# Altium footprint library Connectors SMD.PcbLib: 130 footprints (part 3 of 12) (continued)
## LUMBERG_161314 [mm] "Right Angle Surface Mount Power Supply Chassis Socket With Break Contacts"
height 11
pads (6):
  rect 2.7x2 smd: 1(-4.5,-5.5) 2(1.6,-5.5) 3(-4.5,5.5) 3(1.6,5.5)
  round 1 hole 1.6 unplated mask+0.3: 4(-4.5,0)
  round 1 hole 1.8 unplated mask+0.4: 4(0,0)
Top Overlay:
  lines w0.2: -6.25,-4.5 -9.5,-4.5 -9.5,4.5 -6.25,4.5 ; -6,-4.1 -6,-3 -1.7,-3 ccw(c-1.7,0) -1.7,3 -6,3 -6,4.1 ; -6,-4 4,-4 ; -6,4 4,4 ; -2.75,-4.5 -0.15,-4.5 ; -2.75,4.5 -0.15,4.5 ; -2.75,4.9 -0.15,4.9 ; 3.35,-4.5 4,-4.5 ; 3.35,4.5 4,4.5 4,-4.5 ; 3.35,4.9 4.4,4.9 4.4,-2.4 4,-2.4 ; 4.4,-1.7 5.3,-1.7 5.3,-4.5 4,-4.5
Mechanical 8:
  circle w0.1: c0,0 r0.9
  circle w0.1: c-4.5,0 r0.8
  lines w0.1: -5,-5.5 -4.5,-5.5 ; -5,0 -4.5,0 ; -5,5.5 -4.5,5.5 ; -4.5,-6 -4.5,-5.5 ; -4.5,-5 -4.5,-5.5 ; -4.5,-0.5 -4.5,0 ; -4.5,0.5 -4.5,0 ; -4.5,5 -4.5,5.5 ; -4.5,6 -4.5,5.5 ; -4,-5.5 -4.5,-5.5 ; -4,0 -4.5,0 ; -4,5.5 -4.5,5.5 ; -0.5,0 0,0 ; 0,-0.5 0,0 ; 0,0.5 0,0 ; 0.5,0 0,0 ; 1.1,-5.5 1.6,-5.5 ; 1.1,5.5 1.6,5.5 ; 1.6,-6 1.6,-5.5 ; 1.6,-5 1.6,-5.5 ; 1.6,5 1.6,5.5 ; 1.6,6 1.6,5.5 ; 2.1,-5.5 1.6,-5.5 ; 2.1,5.5 1.6,5.5 ; -5.85,-6.5 -5.85,-4.5 -3.15,-4.5 -3.15,-6.5 -5.85,-6.5 ; -5.85,4.5 -3.15,4.5 -3.15,6.5 -5.85,6.5 -5.85,4.5 ; 0.25,-6.5 2.95,-6.5 2.95,-4.5 0.25,-4.5 0.25,-6.5 ; 0.25,4.5 2.95,4.5 2.95,6.5 0.25,6.5 0.25,4.5
Mechanical 14:
  lines w0.1: -6,-4.5 -6,-3 -1.7,-3 ccw(c-1.7,0) -1.7,3 -6,3 -6,4.5 ; -6,-4 4,-4 ; -6,4 4,4 ; -5.25,-4.9 -3.75,-4.9 ; -5.25,-4.5 -5.25,-6.3 -3.75,-6.3 -3.75,-4.5 ; -5.25,4.5 -5.25,6.3 -3.75,6.3 -3.75,4.9 ; -5.25,4.9 4.4,4.9 4.4,-2.4 4,-2.4 ; 0.85,-4.9 2.35,-4.9 ; 0.85,-4.5 0.85,-6.3 2.35,-6.3 2.35,-4.5 ; 0.85,4.9 0.85,6.3 2.35,6.3 2.35,4.9 ; 4.4,-1.7 5.3,-1.7 5.3,-4.5 4,-4.5 ; 4,-4.5 -9.5,-4.5 -9.5,4.5 4,4.5 4,-4.5
Mechanical 15:
  lines w0.1: -9.75,-6.75 -9.75,6.75 5.55,6.75 5.55,-6.75 -9.75,-6.75
3D body: height 11, standoff -1.2, extent -9.5,-6.3 5.3,6.3

## MITSUBISHI_FU-456RDF-9M2-A [mm] "1.3um Band Transmitter Optical Sub Assembly  (TOSA) Laser Module"
height 14.53
pads (8):
  round 1.1 hole 0.6: 1(-1.7,2.75) 8(-1.7,-2.75)
  rect 1.05x0.45 smd: 2(0,1.975) 3(0,1.185) 4(0,0.395) 5(0,-0.395) 6(0,-1.185) 7(0,-1.975)
Top Overlay:
  circle w0.2: c-13.75,0.2 r2.4
  circle w0.2: c-13.75,0.2 r1
  circle w0.2: c-13.75,0.2 r1.495
  lines w0.2: -12.915,-2.05 -5.45,-2.05 -4.05,-2.75 -2.6,-2.75 ; -12.915,2.45 -4.65,2.45 -4.05,2.75 -2.6,2.75 ; -0.8,-2.75 0.65,-2.75 0.65,-2.605 ; -0.8,2.75 0.65,2.75 0.65,2.605
  text "1" at -3.088,1.25 h1
Mechanical 8:
  lines w0.1: -14,0.2 -13.75,0.2 ; -13.75,-0.05 -13.75,0.2 ; -13.75,0.45 -13.75,0.2 ; -13.5,0.2 -13.75,0.2 ; -1.95,-2.75 -1.7,-2.75 ; -1.95,2.75 -1.7,2.75 ; -1.7,-3 -1.7,-2.75 ; -1.7,-2.5 -1.7,-2.75 ; -1.7,2.5 -1.7,2.75 ; -1.7,3 -1.7,2.75 ; -1.45,-2.75 -1.7,-2.75 ; -1.45,2.75 -1.7,2.75 ; -0.354,-0.354 0,0 ; -0.354,0.354 0,0 ; -0.25,-1.975 0,-1.975 ; -0.25,-1.185 0,-1.185 ; -0.25,-0.395 0,-0.395 ; -0.25,0.395 0,0.395 ; -0.25,1.185 0,1.185 ; -0.25,1.975 0,1.975 ; 0,-2.225 0,-1.975 ; 0,-1.725 0,-1.975 ; 0,-1.435 0,-1.185 ; 0,-0.935 0,-1.185 ; 0,-0.645 0,-0.395 ; 0,-0.145 0,-0.395 ; 0,0.145 0,0.395 ; 0,0.645 0,0.395 ; 0,0.935 0,1.185 ; 0,1.435 0,1.185 ; 0,1.725 0,1.975 ; 0,2.225 0,1.975 ; 0.25,-1.975 0,-1.975 ; 0.25,-1.185 0,-1.185 ; 0.25,-0.395 0,-0.395 ; 0.25,0.395 0,0.395 ; 0.25,1.185 0,1.185 ; 0.25,1.975 0,1.975 ; 0.354,-0.354 0,0 ; 0.354,0.354 0,0
Mechanical 14:
  circle w0.1: c-13.75,0.2 r2.4
  circle w0.1: c-13.75,0.2 r1
  circle w0.1: c-13.75,0.2 r1.495
  lines w0.1: -12.915,-2.05 -5.45,-2.05 -4.05,-2.75 -2,-2.75 cw(c-1.7,-2.75) -1.4,-2.75 0.65,-2.75 0.65,2.75 -1.4,2.75 cw(c-1.7,2.75) -2,2.75 -4.05,2.75 -4.65,2.45 -12.915,2.45 ; -2.2,-2.75 cw(c-1.7,-2.75) -1.2,-2.75 ; -2.2,2.75 ccw(c-1.7,2.75) -1.2,2.75 ; -0.5,-2.175 0.5,-2.175 0.5,-1.775 -0.5,-1.775 -0.5,-2.175 ; -0.5,-1.385 0.5,-1.385 0.5,-0.985 -0.5,-0.985 -0.5,-1.385 ; -0.5,-0.595 0.5,-0.595 0.5,-0.195 -0.5,-0.195 -0.5,-0.595 ; -0.5,0.195 0.5,0.195 0.5,0.595 -0.5,0.595 -0.5,0.195 ; -0.5,0.985 0.5,0.985 0.5,1.385 -0.5,1.385 -0.5,0.985 ; -0.5,1.775 0.5,1.775 0.5,2.175 -0.5,2.175 -0.5,1.775
  text "1" at -3.088,1.25 h1
3D body: height 13.97, standoff -1.07, extent -16.15,-2.75 0.65,2.75

## MOLEX_45802-0223 [mm] "1.20mm by 2.00mm Pitch HD Mezzanine Receptacle, 299 Circuits, 8.00mm Unmated Height, 23 Rows"
height 10.51
pads (307):
  rrect100% 1x0.8 smd: 1A(22,-7.2) 1B(22,-6) 1C(22,-4.8) 1D(22,-3.6) 1E(22,-2.4) 1F(22,-1.2) 1G(22,0) 1H(22,1.2) 1I(22,2.4) 1J(22,3.6) 1K(22,4.8) 1L(22,6) 1M(22,7.2) 2A(20,-7.2) 2B(20,-6) 2C(20,-4.8) 2D(20,-3.6) 2E(20,-2.4) 2F(20,-1.2) 2G(20,0) 2H(20,1.2) 2I(20,2.4) 2J(20,3.6) 2K(20,4.8) 2L(20,6) 2M(20,7.2) 3A(18,-7.2) 3B(18,-6) 3C(18,-4.8) 3D(18,-3.6) 3E(18,-2.4) 3F(18,-1.2) 3G(18,0) 3H(18,1.2) 3I(18,2.4) 3J(18,3.6) 3K(18,4.8) 3L(18,6) 3M(18,7.2) 4A(16,-7.2) 4B(16,-6) 4C(16,-4.8) 4D(16,-3.6) 4E(16,-2.4) 4F(16,-1.2) 4G(16,0) 4H(16,1.2) 4I(16,2.4) 4J(16,3.6) 4K(16,4.8) 4L(16,6) 4M(16,7.2) 5A(14,-7.2) 5B(14,-6) 5C(14,-4.8) 5D(14,-3.6) 5E(14,-2.4) 5F(14,-1.2) 5G(14,0) 5H(14,1.2) 5I(14,2.4) 5J(14,3.6) 5K(14,4.8) 5L(14,6) 5M(14,7.2) 6A(12,-7.2) 6B(12,-6) 6C(12,-4.8) 6D(12,-3.6) 6E(12,-2.4) 6F(12,-1.2) 6G(12,0) 6H(12,1.2) 6I(12,2.4) 6J(12,3.6) 6K(12,4.8) 6L(12,6) 6M(12,7.2) 7A(10,-7.2) 7B(10,-6) 7C(10,-4.8) 7D(10,-3.6) 7E(10,-2.4) 7F(10,-1.2) 7G(10,0) 7H(10,1.2) 7I(10,2.4) 7J(10,3.6) 7K(10,4.8) 7L(10,6) 7M(10,7.2) 8A(8,-7.2) 8B(8,-6) 8C(8,-4.8) 8D(8,-3.6) 8E(8,-2.4) 8F(8,-1.2) 8G(8,0) 8H(8,1.2) 8I(8,2.4) 8J(8,3.6) 8K(8,4.8) 8L(8,6) 8M(8,7.2) 9A(6,-7.2) 9B(6,-6) 9C(6,-4.8) 9D(6,-3.6) 9E(6,-2.4) 9F(6,-1.2) 9G(6,0) 9H(6,1.2) 9I(6,2.4) 9J(6,3.6) 9K(6,4.8) 9L(6,6) 9M(6,7.2) 10A(4,-7.2) 10B(4,-6) 10C(4,-4.8) 10D(4,-3.6) 10E(4,-2.4) 10F(4,-1.2) 10G(4,0) 10H(4,1.2) 10I(4,2.4) 10J(4,3.6) 10K(4,4.8) 10L(4,6) 10M(4,7.2) 11A(2,-7.2) 11B(2,-6) 11C(2,-4.8) 11D(2,-3.6) 11E(2,-2.4) 11F(2,-1.2) 11G(2,0) 11H(2,1.2) 11I(2,2.4) 11J(2,3.6) 11K(2,4.8) 11L(2,6) 11M(2,7.2) 12A(0,-7.2) 12B(0,-6) 12C(0,-4.8) 12D(0,-3.6) 12E(0,-2.4) 12F(0,-1.2) 12G(0,0) 12H(0,1.2) 12I(0,2.4) 12J(0,3.6) 12K(0,4.8) 12L(0,6) 12M(0,7.2) 13A(-2,-7.2) 13B(-2,-6) 13C(-2,-4.8) 13D(-2,-3.6) 13E(-2,-2.4) 13F(-2,-1.2) 13G(-2,0) 13H(-2,1.2) 13I(-2,2.4) 13J(-2,3.6) 13K(-2,4.8) 13L(-2,6) 13M(-2,7.2) 14A(-4,-7.2) 14B(-4,-6) 14C(-4,-4.8) 14D(-4,-3.6) 14E(-4,-2.4) 14F(-4,-1.2) 14G(-4,0) 14H(-4,1.2) 14I(-4,2.4) 14J(-4,3.6) 14K(-4,4.8) 14L(-4,6) 14M(-4,7.2) 15A(-6,-7.2) 15B(-6,-6) 15C(-6,-4.8) 15D(-6,-3.6) 15E(-6,-2.4) 15F(-6,-1.2) 15G(-6,0) 15H(-6,1.2) 15I(-6,2.4) 15J(-6,3.6) 15K(-6,4.8) 15L(-6,6) 15M(-6,7.2) 16A(-8,-7.2) 16B(-8,-6) 16C(-8,-4.8) 16D(-8,-3.6) 16E(-8,-2.4) 16F(-8,-1.2) 16G(-8,0) 16H(-8,1.2) 16I(-8,2.4) 16J(-8,3.6) 16K(-8,4.8) 16L(-8,6) 16M(-8,7.2) 17A(-10,-7.2) 17B(-10,-6) 17C(-10,-4.8) 17D(-10,-3.6) 17E(-10,-2.4) 17F(-10,-1.2) 17G(-10,0) 17H(-10,1.2) 17I(-10,2.4) 17J(-10,3.6) 17K(-10,4.8) 17L(-10,6) 17M(-10,7.2) 18A(-12,-7.2) 18B(-12,-6) 18C(-12,-4.8) 18D(-12,-3.6) 18E(-12,-2.4) 18F(-12,-1.2) 18G(-12,0) 18H(-12,1.2) 18I(-12,2.4) 18J(-12,3.6) 18K(-12,4.8) 18L(-12,6) 18M(-12,7.2) 19A(-14,-7.2) 19B(-14,-6) 19C(-14,-4.8) 19D(-14,-3.6) 19E(-14,-2.4) 19F(-14,-1.2) 19G(-14,0) 19H(-14,1.2) 19I(-14,2.4) 19J(-14,3.6) 19K(-14,4.8) 19L(-14,6) 19M(-14,7.2) 20A(-16,-7.2) 20B(-16,-6) 20C(-16,-4.8) 20D(-16,-3.6) 20E(-16,-2.4) 20F(-16,-1.2) 20G(-16,0) 20H(-16,1.2) 20I(-16,2.4) 20J(-16,3.6) 20K(-16,4.8) 20L(-16,6) 20M(-16,7.2) 21A(-18,-7.2) 21B(-18,-6) 21C(-18,-4.8) 21D(-18,-3.6) 21E(-18,-2.4) 21F(-18,-1.2) 21G(-18,0) 21H(-18,1.2) 21I(-18,2.4) 21J(-18,3.6) 21K(-18,4.8) 21L(-18,6) 21M(-18,7.2) 22A(-20,-7.2) 22B(-20,-6) 22C(-20,-4.8) 22D(-20,-3.6) 22E(-20,-2.4) 22F(-20,-1.2) 22G(-20,0) 22H(-20,1.2) 22I(-20,2.4) 22J(-20,3.6) 22K(-20,4.8) 22L(-20,6) 22M(-20,7.2) 23A(-22,-7.2) 23B(-22,-6) 23C(-22,-4.8) 23D(-22,-3.6) 23E(-22,-2.4) 23F(-22,-1.2) 23G(-22,0) 23H(-22,1.2) 23I(-22,2.4) 23J(-22,3.6) 23K(-22,4.8) 23L(-22,6) 23M(-22,7.2)
  round 1 hole 1.75 unplated mask+0.375: MTG1(-28.15,-6.5)
  round 1 hole 1.25 unplated mask+0.125: MTG2(-28.15,6.5) MTG3(28.15,6.5) MTG4(28.15,-6.5)
  round 1.8 hole 1.3: MTG5(-25,1.15) MTG6(-25,-1.15) MTG7(25,1.15) MTG8(25,-1.15)
Top Layer:
  region: 24.1,-1.15 24.092,1.15 24.123,1.385 24.214,1.604 24.358,1.792 24.546,1.936 24.765,2.027 25,2.058 25.235,2.027 25.454,1.936 25.642,1.792 25.786,1.604 25.877,1.385 25.908,1.15 25.9,1.15 25.908,-1.15 25.877,-1.385 25.786,-1.604 25.642,-1.792 25.454,-1.936 25.235,-2.027 25,-2.058 24.765,-2.027 24.546,-1.936 24.358,-1.792 24.214,-1.604 24.123,-1.385 24.092,-1.15
  region: -25.9,-1.15 -25.908,1.15 -25.877,1.385 -25.786,1.604 -25.642,1.792 -25.454,1.936 -25.235,2.027 -25,2.058 -24.765,2.027 -24.546,1.936 -24.358,1.792 -24.214,1.604 -24.123,1.385 -24.092,1.15 -24.1,1.15 -24.092,-1.15 -24.123,-1.385 -24.214,-1.604 -24.358,-1.792 -24.546,-1.936 -24.765,-2.027 -25,-2.058 -25.235,-2.027 -25.454,-1.936 -25.642,-1.792 -25.786,-1.604 -25.877,-1.385 -25.908,-1.15
Bottom Layer:
  region: 24.1,-1.15 24.092,1.15 24.123,1.385 24.214,1.604 24.358,1.792 24.546,1.936 24.765,2.027 25,2.058 25.235,2.027 25.454,1.936 25.642,1.792 25.786,1.604 25.877,1.385 25.908,1.15 25.9,1.15 25.908,-1.15 25.877,-1.385 25.786,-1.604 25.642,-1.792 25.454,-1.936 25.235,-2.027 25,-2.058 24.765,-2.027 24.546,-1.936 24.358,-1.792 24.214,-1.604 24.123,-1.385 24.092,-1.15
  region: -25.9,-1.15 -25.908,1.15 -25.877,1.385 -25.786,1.604 -25.642,1.792 -25.454,1.936 -25.235,2.027 -25,2.058 -24.765,2.027 -24.546,1.936 -24.358,1.792 -24.214,1.604 -24.123,1.385 -24.092,1.15 -24.1,1.15 -24.092,-1.15 -24.123,-1.385 -24.214,-1.604 -24.358,-1.792 -24.546,-1.936 -24.765,-2.027 -25,-2.058 -25.235,-2.027 -25.454,-1.936 -25.642,-1.792 -25.786,-1.604 -25.877,-1.385 -25.908,-1.15
Top Overlay:
  drawing of 357 lines, arcs and shapes, not listed
Mechanical 8:
  drawing of 2456 lines, arcs and shapes, not listed
Mechanical 14:
  drawing of 495 lines, arcs and shapes, not listed
Mechanical 15:
  lines w0.05: -29.665,-11.5 -29.665,-3.302 cw(c-28.775,0) -29.665,3.302 -29.665,11.5 29.665,11.5 29.665,3.302 cw(c28.775,0) 31.165,-2.446 31.165,-11.5 -29.665,-11.5
3D body: height 10.51, standoff -1.99, extent -31.945,-11.25 31.945,11.25

## MOLEX_45830-0223 [mm] "1.20mm by 2.00mm Pitch HD Mezzanine Plug, 299 Circuits, 8.00mm Unmated Height, 23 Rows"
height 10.41
pads (305):
  rrect100% 1x0.8 smd: 1A(-22,-7.2) 1B(-22,-6) 1C(-22,-4.8) 1D(-22,-3.6) 1E(-22,-2.4) 1F(-22,-1.2) 1G(-22,0) 1H(-22,1.2) 1I(-22,2.4) 1J(-22,3.6) 1K(-22,4.8) 1L(-22,6) 1M(-22,7.2) 2A(-20,-7.2) 2B(-20,-6) 2C(-20,-4.8) 2D(-20,-3.6) 2E(-20,-2.4) 2F(-20,-1.2) 2G(-20,0) 2H(-20,1.2) 2I(-20,2.4) 2J(-20,3.6) 2K(-20,4.8) 2L(-20,6) 2M(-20,7.2) 3A(-18,-7.2) 3B(-18,-6) 3C(-18,-4.8) 3D(-18,-3.6) 3E(-18,-2.4) 3F(-18,-1.2) 3G(-18,0) 3H(-18,1.2) 3I(-18,2.4) 3J(-18,3.6) 3K(-18,4.8) 3L(-18,6) 3M(-18,7.2) 4A(-16,-7.2) 4B(-16,-6) 4C(-16,-4.8) 4D(-16,-3.6) 4E(-16,-2.4) 4F(-16,-1.2) 4G(-16,0) 4H(-16,1.2) 4I(-16,2.4) 4J(-16,3.6) 4K(-16,4.8) 4L(-16,6) 4M(-16,7.2) 5A(-14,-7.2) 5B(-14,-6) 5C(-14,-4.8) 5D(-14,-3.6) 5E(-14,-2.4) 5F(-14,-1.2) 5G(-14,0) 5H(-14,1.2) 5I(-14,2.4) 5J(-14,3.6) 5K(-14,4.8) 5L(-14,6) 5M(-14,7.2) 6A(-12,-7.2) 6B(-12,-6) 6C(-12,-4.8) 6D(-12,-3.6) 6E(-12,-2.4) 6F(-12,-1.2) 6G(-12,0) 6H(-12,1.2) 6I(-12,2.4) 6J(-12,3.6) 6K(-12,4.8) 6L(-12,6) 6M(-12,7.2) 7A(-10,-7.2) 7B(-10,-6) 7C(-10,-4.8) 7D(-10,-3.6) 7E(-10,-2.4) 7F(-10,-1.2) 7G(-10,0) 7H(-10,1.2) 7I(-10,2.4) 7J(-10,3.6) 7K(-10,4.8) 7L(-10,6) 7M(-10,7.2) 8A(-8,-7.2) 8B(-8,-6) 8C(-8,-4.8) 8D(-8,-3.6) 8E(-8,-2.4) 8F(-8,-1.2) 8G(-8,0) 8H(-8,1.2) 8I(-8,2.4) 8J(-8,3.6) 8K(-8,4.8) 8L(-8,6) 8M(-8,7.2) 9A(-6,-7.2) 9B(-6,-6) 9C(-6,-4.8) 9D(-6,-3.6) 9E(-6,-2.4) 9F(-6,-1.2) 9G(-6,0) 9H(-6,1.2) 9I(-6,2.4) 9J(-6,3.6) 9K(-6,4.8) 9L(-6,6) 9M(-6,7.2) 10A(-4,-7.2) 10B(-4,-6) 10C(-4,-4.8) 10D(-4,-3.6) 10E(-4,-2.4) 10F(-4,-1.2) 10G(-4,0) 10H(-4,1.2) 10I(-4,2.4) 10J(-4,3.6) 10K(-4,4.8) 10L(-4,6) 10M(-4,7.2) 11A(-2,-7.2) 11B(-2,-6) 11C(-2,-4.8) 11D(-2,-3.6) 11E(-2,-2.4) 11F(-2,-1.2) 11G(-2,0) 11H(-2,1.2) 11I(-2,2.4) 11J(-2,3.6) 11K(-2,4.8) 11L(-2,6) 11M(-2,7.2) 12A(0,-7.2) 12B(0,-6) 12C(0,-4.8) 12D(0,-3.6) 12E(0,-2.4) 12F(0,-1.2) 12G(0,0) 12H(0,1.2) 12I(0,2.4) 12J(0,3.6) 12K(0,4.8) 12L(0,6) 12M(0,7.2) 13A(2,-7.2) 13B(2,-6) 13C(2,-4.8) 13D(2,-3.6) 13E(2,-2.4) 13F(2,-1.2) 13G(2,0) 13H(2,1.2) 13I(2,2.4) 13J(2,3.6) 13K(2,4.8) 13L(2,6) 13M(2,7.2) 14A(4,-7.2) 14B(4,-6) 14C(4,-4.8) 14D(4,-3.6) 14E(4,-2.4) 14F(4,-1.2) 14G(4,0) 14H(4,1.2) 14I(4,2.4) 14J(4,3.6) 14K(4,4.8) 14L(4,6) 14M(4,7.2) 15A(6,-7.2) 15B(6,-6) 15C(6,-4.8) 15D(6,-3.6) 15E(6,-2.4) 15F(6,-1.2) 15G(6,0) 15H(6,1.2) 15I(6,2.4) 15J(6,3.6) 15K(6,4.8) 15L(6,6) 15M(6,7.2) 16A(8,-7.2) 16B(8,-6) 16C(8,-4.8) 16D(8,-3.6) 16E(8,-2.4) 16F(8,-1.2) 16G(8,0) 16H(8,1.2) 16I(8,2.4) 16J(8,3.6) 16K(8,4.8) 16L(8,6) 16M(8,7.2) 17A(10,-7.2) 17B(10,-6) 17C(10,-4.8) 17D(10,-3.6) 17E(10,-2.4) 17F(10,-1.2) 17G(10,0) 17H(10,1.2) 17I(10,2.4) 17J(10,3.6) 17K(10,4.8) 17L(10,6) 17M(10,7.2) 18A(12,-7.2) 18B(12,-6) 18C(12,-4.8) 18D(12,-3.6) 18E(12,-2.4) 18F(12,-1.2) 18G(12,0) 18H(12,1.2) 18I(12,2.4) 18J(12,3.6) 18K(12,4.8) 18L(12,6) 18M(12,7.2) 19A(14,-7.2) 19B(14,-6) 19C(14,-4.8) 19D(14,-3.6) 19E(14,-2.4) 19F(14,-1.2) 19G(14,0) 19H(14,1.2) 19I(14,2.4) 19J(14,3.6) 19K(14,4.8) 19L(14,6) 19M(14,7.2) 20A(16,-7.2) 20B(16,-6) 20C(16,-4.8) 20D(16,-3.6) 20E(16,-2.4) 20F(16,-1.2) 20G(16,0) 20H(16,1.2) 20I(16,2.4) 20J(16,3.6) 20K(16,4.8) 20L(16,6) 20M(16,7.2) 21A(18,-7.2) 21B(18,-6) 21C(18,-4.8) 21D(18,-3.6) 21E(18,-2.4) 21F(18,-1.2) 21G(18,0) 21H(18,1.2) 21I(18,2.4) 21J(18,3.6) 21K(18,4.8) 21L(18,6) 21M(18,7.2) 22A(20,-7.2) 22B(20,-6) 22C(20,-4.8) 22D(20,-3.6) 22E(20,-2.4) 22F(20,-1.2) 22G(20,0) 22H(20,1.2) 22I(20,2.4) 22J(20,3.6) 22K(20,4.8) 22L(20,6) 22M(20,7.2) 23A(22,-7.2) 23B(22,-6) 23C(22,-4.8) 23D(22,-3.6) 23E(22,-2.4) 23F(22,-1.2) 23G(22,0) 23H(22,1.2) 23I(22,2.4) 23J(22,3.6) 23K(22,4.8) 23L(22,6) 23M(22,7.2)
  round 4 hole 1.75: MTG1(-28.775,0) MTG2(28.775,0)
  round 1 hole 1.25 unplated mask+0.125: MTG3(-28.15,-6.5) MTG5(-28.15,6.5) MTG6(28.15,6.5)
  round 1 hole 1.75 unplated mask+0.375: MTG4(28.15,-6.5)
Top Overlay:
  drawing of 245 lines, arcs and shapes, not listed
Mechanical 8:
  drawing of 2424 lines, arcs and shapes, not listed
Mechanical 14:
  drawing of 528 lines, arcs and shapes, not listed
Mechanical 15:
  lines w0.05: -31.115,-11.5 -31.115,-0.902 cw(c-28.73,0) -29.615,2.392 -29.615,11.5 29.615,11.5 29.615,2.391 cw(c28.73,0) 29.615,-2.392 29.615,-11.5 -31.115,-11.5
3D body: height 13.35, standoff -1.99, extent -31.075,-11.25 31.075,11.25

## MOLEX_46765-0001 [mm] "0.4mm Pitch, Surface Mount Right Angle 19 Contacts Micro HDMI Type-D Receptacle With Kapton Tape  And SMT Mounting Pads"
height 2.9
pads (23):
  rect 0.23x0.85 smd: 1(1.8,0.613) 3(1.4,0.613) 5(1,0.613) 7(0.6,0.613) 9(0.2,0.613) 11(-0.2,0.613) 13(-0.6,0.613) 15(-1,0.613) 17(-1.4,0.613) 19(-1.8,0.613)
  rect 0.23x1 smd: 2(1.6,-0.613) 4(1.2,-0.613) 6(0.8,-0.613) 8(0.4,-0.613) 10(0,-0.613) 12(-0.4,-0.613) 14(-0.8,-0.613) 16(-1.2,-0.613) 18(-1.6,-0.613)
  rect 1.7x2 smd: SHIELD(-2.85,-4.163) SHIELD(2.85,-4.163)
  rect 1.8x1.38 smd: SHIELD(-2.85,-0.793) SHIELD(2.85,-0.793)
Top Overlay:
  lines w0.2: -3.25,-5.863 -3.25,-6.563 3.25,-6.563 3.25,-5.863
Mechanical 8:
  drawing of 201 lines, arcs and shapes, not listed
Mechanical 14:
  lines w0.1: -3.25,-6.563 3.25,-6.563 3.25,0.938 -3.25,0.938 -3.25,-6.563
Mechanical 15:
  lines w0.1: -3.5,-6.813 3.5,-6.813 3.5,1.288 -3.5,1.288 -3.5,-6.813
3D body: height 2.97, standoff 0, extent -3.25,-6.562 3.25,0.938

## MOLEX_46765-1001 [mm] "0.4mm Pitch, Surface Mount Right Angle 19 Contacts Micro HDMI Type-D Receptacle With Kapton Tape  And Thru Hole Mounting Pads"
height 2.9
pads (23):
  rect 0.23x0.85 smd: 1(1.8,0.613) 3(1.4,0.613) 5(1,0.613) 7(0.6,0.613) 9(0.2,0.613) 11(-0.2,0.613) 13(-0.6,0.613) 15(-1,0.613) 17(-1.4,0.613) 19(-1.8,0.613)
  rect 0.23x1 smd: 2(1.6,-0.613) 4(1.2,-0.613) 6(0.8,-0.613) 8(0.4,-0.613) 10(0,-0.613) 12(-0.4,-0.613) 14(-0.8,-0.613) 16(-1.2,-0.613) 18(-1.6,-0.613)
  oval 1.5x2.55 hole 0.65 slot 1.7 at 90 deg: SHIELD(-3.1,-4.163) SHIELD(-3.1,-0.753) SHIELD(3.1,-4.163) SHIELD(3.1,-0.753)
Top Overlay:
  lines w0.2: -3.25,-5.863 -3.25,-6.563 3.25,-6.563 3.25,-5.863
Mechanical 8:
  drawing of 205 lines, arcs and shapes, not listed
Mechanical 14:
  lines w0.1: -3.25,-6.563 3.25,-6.563 3.25,0.938 -3.25,0.938 -3.25,-6.563
Mechanical 15:
  lines w0.05: -3.5,-6.813 3.5,-6.813 3.5,1.288 -3.5,1.288 -3.5,-6.813
3D body: height 2.97, standoff -0.55, extent -3.25,-6.562 3.25,0.938

## MOLEX_47082-1000 [mm] "1.27mm (.050\") Pitch, Surface Mount with Shell, Right Angle, External Metal-Shielded, Serial ATA Plug (SATA)"
height 5.5
pads (13):
  rect 0.6x1.7 smd: 1(-3.81,0) 2(-2.54,0) 3(-1.27,0) 4(0,0) 5(1.27,0) 6(2.54,0) 7(3.81,0)
  round 2.4 hole 1.7: 8(-9.38,-8.435) 8(-9.38,0.515) 8(9.02,-8.435) 8(9.02,0.515) MTG2(7.2,-2.835)
  round 2.1 hole 1.4: MTG1(-7.2,-1.935)
Top Overlay:
  circle w0.25: c-3.844,1.411 r0.125
  lines w0.2: -9.58,-11.53 -8.835,-11.53 -8.83,-11.535 4.52,-11.535 4.525,-11.53 9.22,-11.53 ; -9.58,-10.022 -9.58,-11.73 cw(c-9.78,-11.73) -9.78,-11.93 -10.73,-11.93 -10.73,-12.33 -9.78,-12.33 ccw(c-9.78,-11.73) -9.18,-11.73 ; -9.58,-6.847 -9.58,-1.072 ; -7.832,0.92 -4.51,0.92 ; -4.51,0.225 -5.856,0.225 cw(c-5.68,0.32) -5.88,0.32 -5.88,0.52 -4.51,0.52 ; -3.68,-11.535 -3.68,-11.93 -5.862,-11.93 ccw(c-5.862,-12.83) -6.533,-12.23 cw(c-6.98,-11.83) -7.536,-12.055 -7.907,-12.205 ccw(c-6.98,-11.83) -6.235,-12.497 cw(c-5.862,-12.83) -5.862,-12.33 5.502,-12.33 cw(c5.502,-12.83) 5.875,-12.497 ccw(c6.62,-11.83) 7.547,-12.205 7.176,-12.055 cw(c6.62,-11.83) 6.173,-12.23 ccw(c5.502,-12.83) 5.502,-11.93 3.32,-11.93 3.32,-11.535 ; 4.51,0.225 5.496,0.225 ccw(c5.32,0.32) 5.52,0.32 5.52,0.92 ; 4.51,0.52 5.52,0.52 ; 4.51,0.92 7.472,0.92 ; 8.82,-11.53 8.82,-11.73 ccw(c9.42,-11.73) 9.42,-12.33 10.37,-12.33 10.37,-11.93 9.42,-11.93 cw(c9.42,-11.73) 9.22,-11.73 9.22,-10.022 ; 9.22,-6.847 9.22,-1.072 ; -9.18,-11.73 -9.18,-11.53 -9.18,-11.73 ; -4.73,-10.73 ccw(c-4.53,-10.73) -4.53,-10.93 ; -4.73,-10.73 ccw(c-4.53,-10.73) -4.53,-10.93 ; -4.73,-10.73 -4.73,-5.13 ; -4.73,-10.73 -4.73,-5.13 ; -4.73,-5.13 cw(c-4.53,-5.13) -4.33,-5.13 ; -4.73,-5.13 cw(c-4.53,-5.13) -4.33,-5.13 ; -4.53,-10.93 -2.63,-10.93 ; -4.53,-10.93 -2.63,-10.93 ; -4.33,-9.759 ccw(c-4.13,-9.759) -4.13,-9.959 ; -4.33,-9.759 ccw(c-4.13,-9.759) -4.13,-9.959 ; -4.33,-9.759 -4.33,-5.13 ; -4.33,-9.759 -4.33,-5.13 ; -4.13,-9.959 -3.03,-9.959 ; -4.13,-9.959 -3.03,-9.959 ; -3.03,-9.959 ccw(c-3.03,-9.759) -2.83,-9.759 ; -3.03,-9.959 ccw(c-3.03,-9.759) -2.83,-9.759 ; -2.83,-9.759 -2.83,-5.13 ; -2.83,-9.759 -2.83,-5.13 ; -2.83,-5.13 cw(c-2.63,-5.13) -2.43,-5.13 ; -2.83,-5.13 cw(c-2.63,-5.13) -2.43,-5.13 ; -2.63,-10.93 ccw(c-2.63,-10.73) -2.43,-10.73 ; -2.63,-10.93 ccw(c-2.63,-10.73) -2.43,-10.73 ; -2.43,-10.73 -2.43,-5.13 ; -2.43,-10.73 -2.43,-5.13 ; -2.43,-10.73 -2.43,-5.13 ; -2.43,-10.73 -2.43,-5.13 ; 2.07,-10.73 ccw(c2.27,-10.73) 2.27,-10.93 ; 2.07,-10.73 ccw(c2.27,-10.73) 2.27,-10.93 ; 2.07,-10.73 2.07,-5.13 ; 2.07,-10.73 2.07,-5.13 ; 2.07,-5.13 cw(c2.27,-5.13) 2.47,-5.13 ; 2.07,-5.13 cw(c2.27,-5.13) 2.47,-5.13 ; 2.27,-10.93 4.17,-10.93 ; 2.27,-10.93 4.17,-10.93 ; 2.47,-9.759 ccw(c2.67,-9.759) 2.67,-9.959 ; 2.47,-9.759 ccw(c2.67,-9.759) 2.67,-9.959 ; 2.47,-9.759 2.47,-5.13 ; 2.47,-9.759 2.47,-5.13 ; 2.67,-9.959 3.77,-9.959 ; 2.67,-9.959 3.77,-9.959 ; 3.77,-9.959 ccw(c3.77,-9.759) 3.97,-9.759 ; 3.77,-9.959 ccw(c3.77,-9.759) 3.97,-9.759 ; 3.97,-9.759 3.97,-5.13 ; 3.97,-9.759 3.97,-5.13 ; 3.97,-5.13 cw(c4.17,-5.13) 4.37,-5.13 ; 3.97,-5.13 cw(c4.17,-5.13) 4.37,-5.13 ; 4.17,-10.93 ccw(c4.17,-10.73) 4.37,-10.73 ; 4.17,-10.93 ccw(c4.17,-10.73) 4.37,-10.73 ; 4.37,-10.73 4.37,-5.13 ; 4.37,-10.73 4.37,-5.13 ; 4.37,-10.73 4.37,-5.13 ; 4.37,-10.73 4.37,-5.13
Mechanical 8:
  circle w0.1: c-7.2,-1.935 r1.05
  circle w0.1: c9.02,-8.435 r1.2
  circle w0.1: c-9.38,-8.435 r1.2
  circle w0.1: c-9.38,0.515 r1.2
  circle w0.1: c9.02,0.515 r1.2
  circle w0.1: c-9.38,-8.435 r0.85
  circle w0.1: c-9.38,0.515 r0.85
  circle w0.1: c9.02,0.515 r0.85
  circle w0.1: c9.02,-8.435 r0.85
  circle w0.1: c7.2,-2.835 r0.85
  circle w0.1: c-7.2,-1.935 r0.7
  lines w0.1: -9.88,-8.435 -9.38,-8.435 ; -9.88,0.515 -9.38,0.515 ; -9.38,-8.935 -9.38,-8.435 ; -9.38,-7.935 -9.38,-8.435 ; -9.38,0.015 -9.38,0.515 ; -9.38,1.015 -9.38,0.515 ; -8.88,-8.435 -9.38,-8.435 ; -8.88,0.515 -9.38,0.515 ; -7.7,-1.935 -7.2,-1.935 ; -7.2,-2.435 -7.2,-1.935 ; -7.2,-1.435 -7.2,-1.935 ; -6.7,-1.935 -7.2,-1.935 ; -4.31,0 -3.81,0 ; -3.81,-0.5 -3.81,0 ; -3.81,0.5 -3.81,0 ; -3.31,0 -3.81,0 ; -3.04,0 -2.54,0 ; -2.54,-0.5 -2.54,0 ; -2.54,0.5 -2.54,0 ; -2.04,0 -2.54,0 ; -1.77,0 -1.27,0 ; -1.27,-0.5 -1.27,0 ; -1.27,0.5 -1.27,0 ; -0.77,0 -1.27,0 ; -0.5,0 0,0 ; 0,-0.5 0,0 ; 0,0.5 0,0 ; 0.5,0 0,0 ; 0.77,0 1.27,0 ; 1.27,-0.5 1.27,0 ; 1.27,0.5 1.27,0 ; 1.77,0 1.27,0 ; 2.04,0 2.54,0 ; 2.54,-0.5 2.54,0 ; 2.54,0.5 2.54,0 ; 3.04,0 2.54,0 ; 3.31,0 3.81,0 ; 3.81,-0.5 3.81,0 ; 3.81,0.5 3.81,0 ; 4.31,0 3.81,0 ; 6.7,-2.835 7.2,-2.835 ; 7.2,-3.335 7.2,-2.835 ; 7.2,-2.335 7.2,-2.835 ; 7.7,-2.835 7.2,-2.835 ; 8.52,-8.435 9.02,-8.435 ; 8.52,0.515 9.02,0.515 ; 9.02,-8.935 9.02,-8.435 ; 9.02,-7.935 9.02,-8.435 ; 9.02,0.015 9.02,0.515 ; 9.02,1.015 9.02,0.515 ; 9.52,-8.435 9.02,-8.435 ; 9.52,0.515 9.02,0.515 ; -4.11,-0.835 -3.51,-0.835 -3.51,0.865 -4.11,0.865 -4.11,-0.835 ; -2.84,-0.835 -2.84,0.865 -2.24,0.865 -2.24,-0.835 -2.84,-0.835 ; -1.57,-0.835 -1.57,0.865 -0.97,0.865 -0.97,-0.835 -1.57,-0.835 ; -0.3,-0.835 -0.3,0.865 0.3,0.865 0.3,-0.835 -0.3,-0.835 ; 0.97,-0.835 0.97,0.865 1.57,0.865 1.57,-0.835 0.97,-0.835 ; 2.24,-0.835 2.24,0.865 2.84,0.865 2.84,-0.835 2.24,-0.835 ; 3.51,-0.835 3.51,0.865 4.11,0.865 4.11,-0.835 3.51,-0.835
Mechanical 14:
  circle w0.25: c-3.844,1.411 r0.125
  lines w0.1: -9.58,-11.53 -8.835,-11.53 -8.83,-11.535 4.52,-11.535 4.525,-11.53 9.22,-11.53 ; -9.58,0.12 -8.08,0.12 ccw(c-8.08,0.32) -7.88,0.32 ; -3.68,-11.535 -3.68,-11.93 -5.862,-11.93 ccw(c-5.862,-12.83) -6.533,-12.23 cw(c-6.98,-11.83) -7.536,-12.055 -7.907,-12.205 ccw(c-6.98,-11.83) -6.235,-12.497 cw(c-5.862,-12.83) -5.862,-12.33 5.502,-12.33 cw(c5.502,-12.83) 5.875,-12.497 ccw(c6.62,-11.83) 7.547,-12.205 7.176,-12.055 cw(c6.62,-11.83) 6.173,-12.23 ccw(c5.502,-12.83) 5.502,-11.93 3.32,-11.93 3.32,-11.535 ; 5.52,0.52 0.82,0.52 0.82,0.32 ccw(c1.02,0.32) 0.844,0.225 5.496,0.225 ccw(c5.32,0.32) 5.52,0.32 5.52,0.92 ; 5.688,-12.663 ccw(c6.62,-11.83) 7.779,-12.298 ; 8.82,-11.53 8.82,-11.73 ccw(c9.42,-11.73) 9.42,-12.33 10.37,-12.33 10.37,-11.93 9.42,-11.93 cw(c9.42,-11.73) 9.22,-11.73 9.22,1.27 8.82,1.27 8.82,0.286 ccw(c8.62,-0.28) 8.62,0.32 7.52,0.32 ; 9.22,0.12 7.72,0.12 cw(c7.72,0.32) 7.52,0.32 ; -9.18,-11.73 cw(c-9.78,-11.73) -9.78,-12.33 -10.73,-12.33 -10.73,-11.93 -9.78,-11.93 ccw(c-9.78,-11.73) -9.58,-11.73 -9.58,1.27 -9.18,1.27 -9.18,0.286 cw(c-8.98,-0.28) -8.98,0.32 -7.88,0.32 ; -9.18,-11.73 -9.18,-11.53 -9.18,-11.73 ; -7.88,0.32 -7.88,0.52 -8.779,0.52 -8.779,0.92 8.42,0.92 8.42,0.52 7.52,0.52 7.52,0.32 ; -4.73,-10.73 ccw(c-4.53,-10.73) -4.53,-10.93 ; -4.73,-10.73 ccw(c-4.53,-10.73) -4.53,-10.93 ; -4.73,-10.73 -4.73,-5.13 ; -4.73,-10.73 -4.73,-5.13 ; -4.73,-5.13 cw(c-4.53,-5.13) -4.33,-5.13 ; -4.73,-5.13 cw(c-4.53,-5.13) -4.33,-5.13 ; -4.53,-10.93 -2.63,-10.93 ; -4.53,-10.93 -2.63,-10.93 ; -4.33,-9.759 ccw(c-4.13,-9.759) -4.13,-9.959 ; -4.33,-9.759 ccw(c-4.13,-9.759) -4.13,-9.959 ; -4.33,-9.759 -4.33,-5.13 ; -4.33,-9.759 -4.33,-5.13 ; -4.13,-9.959 -3.03,-9.959 ; -4.13,-9.959 -3.03,-9.959 ; -3.03,-9.959 ccw(c-3.03,-9.759) -2.83,-9.759 ; -3.03,-9.959 ccw(c-3.03,-9.759) -2.83,-9.759 ; -2.83,-9.759 -2.83,-5.13 ; -2.83,-9.759 -2.83,-5.13 ; -2.83,-5.13 cw(c-2.63,-5.13) -2.43,-5.13 ; -2.83,-5.13 cw(c-2.63,-5.13) -2.43,-5.13 ; -2.63,-10.93 ccw(c-2.63,-10.73) -2.43,-10.73 ; -2.63,-10.93 ccw(c-2.63,-10.73) -2.43,-10.73 ; -2.43,-10.73 -2.43,-5.13 ; -2.43,-10.73 -2.43,-5.13 ; -2.43,-10.73 -2.43,-5.13 ; -2.43,-10.73 -2.43,-5.13 ; 2.07,-10.73 ccw(c2.27,-10.73) 2.27,-10.93 ; 2.07,-10.73 ccw(c2.27,-10.73) 2.27,-10.93 ; 2.07,-10.73 2.07,-5.13 ; 2.07,-10.73 2.07,-5.13 ; 2.07,-5.13 cw(c2.27,-5.13) 2.47,-5.13 ; 2.07,-5.13 cw(c2.27,-5.13) 2.47,-5.13 ; 2.27,-10.93 4.17,-10.93 ; 2.27,-10.93 4.17,-10.93 ; 2.47,-9.759 ccw(c2.67,-9.759) 2.67,-9.959 ; 2.47,-9.759 ccw(c2.67,-9.759) 2.67,-9.959 ; 2.47,-9.759 2.47,-5.13 ; 2.47,-9.759 2.47,-5.13 ; 2.67,-9.959 3.77,-9.959 ; 2.67,-9.959 3.77,-9.959 ; 3.77,-9.959 ccw(c3.77,-9.759) 3.97,-9.759 ; 3.77,-9.959 ccw(c3.77,-9.759) 3.97,-9.759 ; 3.97,-9.759 3.97,-5.13 ; 3.97,-9.759 3.97,-5.13 ; 3.97,-5.13 cw(c4.17,-5.13) 4.37,-5.13 ; 3.97,-5.13 cw(c4.17,-5.13) 4.37,-5.13 ; 4.17,-10.93 ccw(c4.17,-10.73) 4.37,-10.73 ; 4.17,-10.93 ccw(c4.17,-10.73) 4.37,-10.73 ; 4.37,-10.73 4.37,-5.13 ; 4.37,-10.73 4.37,-5.13 ; 4.37,-10.73 4.37,-5.13 ; 4.37,-10.73 4.37,-5.13 ; -5.88,0.32 ccw(c-5.68,0.32) -5.856,0.225 -1.204,0.225 ccw(c-1.38,0.32) -1.18,0.32 -1.18,0.52 -5.88,0.52 -5.88,0.32
Mechanical 15:
  lines w0.1: -10.98,-13.08 10.62,-13.08 10.62,1.965 -10.98,1.965 -10.98,-13.08
3D body: height 6.9, standoff -2.1, extent -10.73,-12.828 10.37,1.27

## MOLEX_52991-0308 [mm] "0.50mm Pitch SlimStack™ Dual Row 30 Circuits Surface Mount Vertical Receptacle (3.00 and 4.00mm Stacking Heights)"
height 2.27
pads (30):
  rect 0.25x1.8 smd: 1(-3.5,-2) 2(-3.5,2) 3(-3,-2) 4(-3,2) 5(-2.5,-2) 6(-2.5,2) 7(-2,-2) 8(-2,2) 9(-1.5,-2) 10(-1.5,2) 11(-1,-2) 12(-1,2) 13(-0.5,-2) 14(-0.5,2) 15(0,-2) 16(0,2) 17(0.5,-2) 18(0.5,2) 19(1,-2) 20(1,2) 21(1.5,-2) 22(1.5,2) 23(2,-2) 24(2,2) 25(2.5,-2) 26(2.5,2) 27(3,-2) 28(3,2) 29(3.5,-2) 30(3.5,2)
Top Overlay:
  circle w0.25: c-5.644,-2.889 r0.125
  lines w0.2: -5.65,-1.2 -4.81,-1.2 -4.81,1.2 -5.65,1.2 ; -5.65,1.9 -5.45,1.9 -5.45,2.15 -4.45,2.15 ; -5.525,-0.8 -5.525,-1.135 ; -5.525,0.8 -5.525,1.135 ; -5.45,-0.8 -5.45,-1.06 ; -5.45,0.8 -5.45,1.06 ; -4.025,-2.15 -4.45,-2.15 -4.45,-2.7 -5.1,-2.7 -5.65,-2.15 -5.65,-0.8 -4.95,-0.8 ; -4.025,-1.73 -4.55,-1.73 ; -4.025,-1.63 -4.45,-1.63 ; -4.025,1.63 -4.45,1.63 ; -4.025,1.73 -4.55,1.73 ; -4.025,2.15 -4.45,2.15 ; -3.85,-0.7 -3.85,0.7 ; 3.85,-0.7 3.85,0.7 ; 4.025,-2.15 4.45,-2.15 4.45,-2.7 5.65,-2.7 5.65,-0.8 ; 4.025,-1.73 4.55,-1.73 ; 4.025,-1.63 4.45,-1.63 ; 4.025,1.63 4.45,1.63 ; 4.025,1.73 4.55,1.73 ; 4.025,2.15 4.45,2.15 ; 5.45,-0.8 5.45,-1.06 ; 5.45,0.8 5.45,1.06 ; 5.525,-0.8 5.525,-1.135 ; 5.525,0.8 5.525,1.135 ; 5.65,-1.2 4.81,-1.2 4.81,1.2 5.65,1.2 ; 5.65,1.9 5.45,1.9 5.45,2.15 4.45,2.15 ; -5.525,-1.135 -4.875,-1.135 ; -5.525,-1.135 -5.45,-1.06 ; -5.525,1.135 -4.875,1.135 ; -5.525,1.135 -5.45,1.06 ; -5.45,-1.06 -4.95,-1.06 ; -5.45,1.06 -4.95,1.06 ; -4.95,-1.06 -4.95,-0.8 ; -4.95,-1.06 -4.875,-1.135 ; -4.95,-0.8 -4.95,0.8 ; -4.95,0.8 -5.65,0.8 -5.65,2.7 -4.45,2.7 -4.45,2.15 ; -4.95,0.8 -4.95,1.06 ; -4.95,1.06 -4.875,1.135 ; -4.875,-1.135 -4.875,1.135 ; -4.55,-1.73 -4.45,-1.63 ; -4.55,-1.73 -4.55,1.73 ; -4.55,1.73 -4.45,1.63 ; -4.45,-1.63 -4.45,1.63 ; 4.45,-1.63 4.55,-1.73 ; 4.45,-1.63 4.45,1.63 ; 4.45,1.63 4.55,1.73 ; 4.45,2.15 4.45,2.7 5.65,2.7 5.65,0.8 ; 4.55,-1.73 4.55,1.73 ; 4.875,-1.135 5.525,-1.135 ; 4.875,-1.135 4.95,-1.06 ; 4.875,-1.135 4.875,1.135 ; 4.875,1.135 5.525,1.135 ; 4.875,1.135 4.95,1.06 ; 4.95,-1.06 4.95,-0.8 ; 4.95,-1.06 5.45,-1.06 ; 4.95,-0.8 4.95,0.8 ; 4.95,-0.8 5.65,-0.8 ; 4.95,-0.8 5.65,-0.8 ; 4.95,0.8 5.65,0.8 ; 4.95,0.8 5.65,0.8 ; 4.95,0.8 4.95,1.06 ; 4.95,1.06 5.45,1.06 ; 5.45,-1.06 5.525,-1.135 ; 5.45,1.06 5.525,1.135
Mechanical 8:
  drawing of 184 lines, arcs and shapes, not listed
Mechanical 14:
  drawing of 228 lines, arcs and shapes, not listed
Mechanical 15:
  lines w0.05: -5.9,-3.15 -5.9,3.15 5.9,3.15 5.9,-3.15 -5.9,-3.15
3D body: height 2.32, standoff 0, extent -5.65,-2.7 5.65,2.7